# Altium footprint library 按键.PcbLib: 105 footprints (part 1 of 7)
Each footprint in its own frame and in the unit in brackets; x right, y up, seen from the top. Pads: shape width x height; smd on the part's side, far side on the other; paste and mask are expansions set on the pad; w line width, h text height; cw(c..) or ccw(c..) is an arc to the next point about the centre after c.
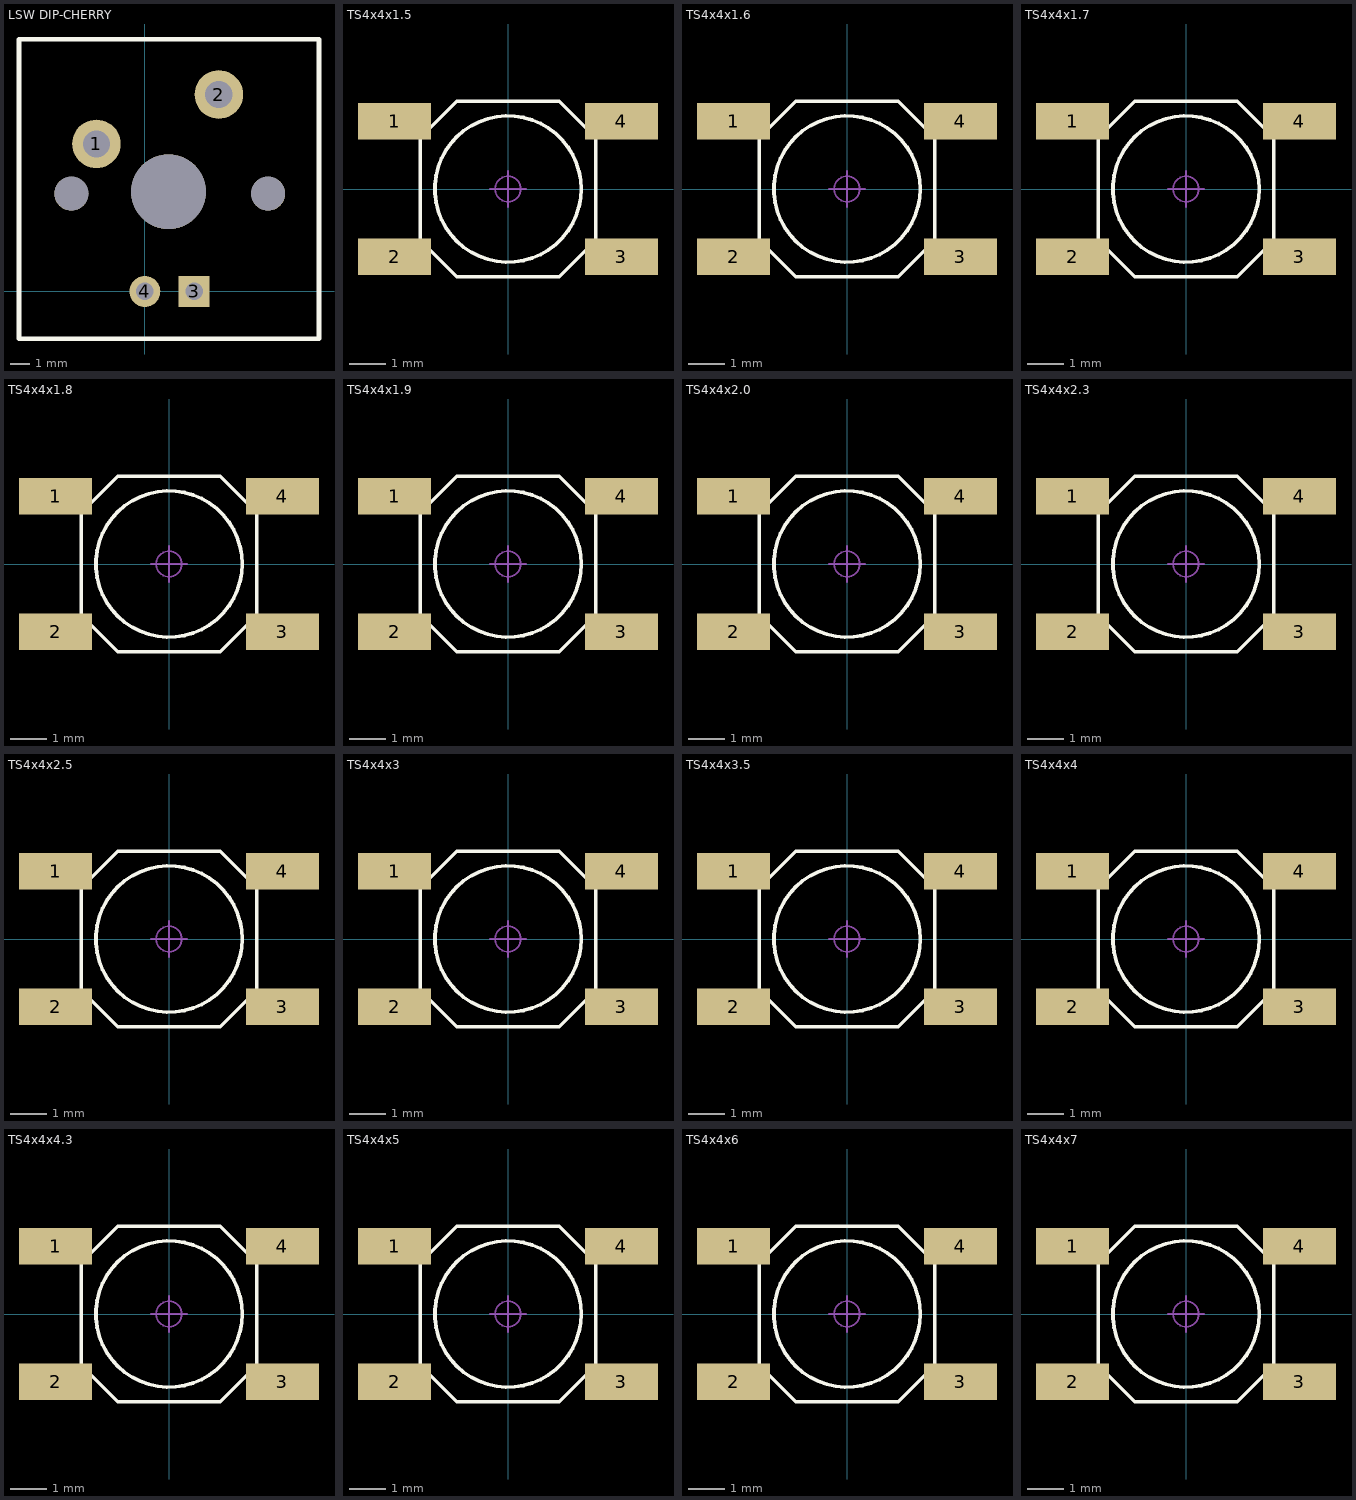
[diagram p0: the footprints below, top view; thin cyan lines are the x and y axes]

## LSW DIP-CHERRY [mm]
pads (7):
  round 2.5 hole 1.4: 1(-2.489,7.595) 2(3.81,10.135)
  rect 1.6x1.6 hole 0.9: 3(2.54,0)
  round 1.6 hole 0.9: 4(0,0)
  round 1.75 hole 1.75: ""(-3.785,5.029) ""(6.35,5.029)
  round 3.85 hole 3.85: ""(1.219,5.131)
Top Overlay:
  lines w0.254: -6.477,-2.438 -6.477,12.979 8.966,12.979 8.966,-2.438 -6.477,-2.438
3D body: height 3.45, standoff -15.75, extent -6.581,-2.669 9.019,12.931

## TS4x4x1.5 [mm] "防水轻触开关4x4x1.5"
pads (4):
  rect 2x1 smd: 1(-3.1,1.85) 2(-3.1,-1.85) 3(3.1,-1.85) 4(3.1,1.85)
Top Overlay:
  circle w0.1: c0,0 r2
  lines w0.1: -2.4,-1.4 -1.4,-2.4 1.4,-2.4 2.4,-1.4 2.4,1.4 1.4,2.4 -1.4,2.4 -2.4,1.4 -2.4,-1.4 ; 0,-2.4 0,-2.4 ; 0,2.4 0,2.4
Mechanical 15:
  circle w0.05: c0,0 r0.35
  lines w0.05: -0.5,0 0.5,0 ; 0,-0.5 0,0.5
3D body: height 1.5, standoff -0.05, extent -3.2,-2.6 3.2,2.6

## TS4x4x1.6 [mm] "防水轻触开关4x4x1.6"
pads (4):
  rect 2x1 smd: 1(-3.1,1.85) 2(-3.1,-1.85) 3(3.1,-1.85) 4(3.1,1.85)
Top Overlay:
  circle w0.1: c0,0 r2
  lines w0.1: -2.4,-1.4 -1.4,-2.4 1.4,-2.4 2.4,-1.4 2.4,1.4 1.4,2.4 -1.4,2.4 -2.4,1.4 -2.4,-1.4 ; 0,-2.4 0,-2.4 ; 0,2.4 0,2.4
Mechanical 15:
  circle w0.05: c0,0 r0.35
  lines w0.05: -0.5,0 0.5,0 ; 0,-0.5 0,0.5
3D body: height 1.6, standoff -0.05, extent -3.2,-2.6 3.2,2.6

## TS4x4x1.7 [mm] "防水轻触开关4x4x1.7"
pads (4):
  rect 2x1 smd: 1(-3.1,1.85) 2(-3.1,-1.85) 3(3.1,-1.85) 4(3.1,1.85)
Top Overlay:
  circle w0.1: c0,0 r2
  lines w0.1: -2.4,-1.4 -1.4,-2.4 1.4,-2.4 2.4,-1.4 2.4,1.4 1.4,2.4 -1.4,2.4 -2.4,1.4 -2.4,-1.4 ; 0,-2.4 0,-2.4 ; 0,2.4 0,2.4
Mechanical 15:
  circle w0.05: c0,0 r0.35
  lines w0.05: -0.5,0 0.5,0 ; 0,-0.5 0,0.5
3D body: height 1.7, standoff -0.05, extent -3.2,-2.6 3.2,2.6

## TS4x4x1.8 [mm] "防水轻触开关4x4x1.8"
pads (4):
  rect 2x1 smd: 1(-3.1,1.85) 2(-3.1,-1.85) 3(3.1,-1.85) 4(3.1,1.85)
Top Overlay:
  circle w0.1: c0,0 r2
  lines w0.1: -2.4,-1.4 -2.4,1.4 -1.4,2.4 1.4,2.4 2.4,1.4 2.4,-1.4 1.4,-2.4 -1.4,-2.4 -2.4,-1.4 ; 0,-2.4 0,-2.4 ; 0,2.4 0,2.4
Mechanical 15:
  circle w0.05: c0,0 r0.35
  lines w0.05: -0.5,0 0.5,0 ; 0,-0.5 0,0.5
3D body: height 1.8, standoff -0.05, extent -3.2,-2.6 3.2,2.6

## TS4x4x1.9 [mm] "防水轻触开关4x4x1.9"
pads (4):
  rect 2x1 smd: 1(-3.1,1.85) 2(-3.1,-1.85) 3(3.1,-1.85) 4(3.1,1.85)
Top Overlay:
  circle w0.1: c0,0 r2
  lines w0.1: -2.4,-1.4 -2.4,1.4 -1.4,2.4 1.4,2.4 2.4,1.4 2.4,-1.4 1.4,-2.4 -1.4,-2.4 -2.4,-1.4 ; 0,-2.4 0,-2.4 ; 0,2.4 0,2.4
Mechanical 15:
  circle w0.05: c0,0 r0.35
  lines w0.05: -0.5,0 0.5,0 ; 0,-0.5 0,0.5
3D body: height 1.9, standoff -0.05, extent -3.2,-2.6 3.2,2.6

## TS4x4x2.0 [mm] "防水轻触开关4x4x2.0"
pads (4):
  rect 2x1 smd: 1(-3.1,1.85) 2(-3.1,-1.85) 3(3.1,-1.85) 4(3.1,1.85)
Top Overlay:
  circle w0.1: c0,0 r2
  lines w0.1: -2.4,-1.4 -2.4,1.4 -1.4,2.4 1.4,2.4 2.4,1.4 2.4,-1.4 1.4,-2.4 -1.4,-2.4 -2.4,-1.4 ; 0,-2.4 0,-2.4 ; 0,2.4 0,2.4
Mechanical 15:
  circle w0.05: c0,0 r0.35
  lines w0.05: -0.5,0 0.5,0 ; 0,-0.5 0,0.5
3D body: height 2, standoff -0.05, extent -3.2,-2.6 3.2,2.6

## TS4x4x2.3 [mm] "防水轻触开关4x4x2.3"
pads (4):
  rect 2x1 smd: 1(-3.1,1.85) 2(-3.1,-1.85) 3(3.1,-1.85) 4(3.1,1.85)
Top Overlay:
  circle w0.1: c0,0 r2
  lines w0.1: -2.4,-1.4 -2.4,1.4 -1.4,2.4 1.4,2.4 2.4,1.4 2.4,-1.4 1.4,-2.4 -1.4,-2.4 -2.4,-1.4 ; 0,-2.4 0,-2.4 ; 0,2.4 0,2.4
Mechanical 15:
  circle w0.05: c0,0 r0.35
  lines w0.05: -0.5,0 0.5,0 ; 0,-0.5 0,0.5
3D body: height 2.3, standoff -0.05, extent -3.2,-2.6 3.2,2.6

## TS4x4x2.5 [mm] "防水轻触开关4x4x2.5"
pads (4):
  rect 2x1 smd: 1(-3.1,1.85) 2(-3.1,-1.85) 3(3.1,-1.85) 4(3.1,1.85)
Top Overlay:
  circle w0.1: c0,0 r2
  lines w0.1: -2.4,-1.4 -1.4,-2.4 1.4,-2.4 2.4,-1.4 2.4,1.4 1.4,2.4 -1.4,2.4 -2.4,1.4 -2.4,-1.4 ; 0,-2.4 0,-2.4 ; 0,2.4 0,2.4
Mechanical 15:
  circle w0.05: c0,0 r0.35
  lines w0.05: -0.5,0 0.5,0 ; 0,-0.5 0,0.5
3D body: height 2.5, standoff -0.05, extent -3.2,-2.6 3.2,2.6

## TS4x4x3 [mm] "防水轻触开关4x4x3"
pads (4):
  rect 2x1 smd: 1(-3.1,1.85) 2(-3.1,-1.85) 3(3.1,-1.85) 4(3.1,1.85)
Top Overlay:
  circle w0.1: c0,0 r2
  lines w0.1: -2.4,-1.4 -2.4,1.4 -1.4,2.4 1.4,2.4 2.4,1.4 2.4,-1.4 1.4,-2.4 -1.4,-2.4 -2.4,-1.4 ; 0,-2.4 0,-2.4 ; 0,2.4 0,2.4
Mechanical 15:
  circle w0.05: c0,0 r0.35
  lines w0.05: -0.5,0 0.5,0 ; 0,-0.5 0,0.5
3D body: height 3, standoff -0.05, extent -3.2,-2.6 3.2,2.6

## TS4x4x3.5 [mm] "防水轻触开关4x4x3.5"
pads (4):
  rect 2x1 smd: 1(-3.1,1.85) 2(-3.1,-1.85) 3(3.1,-1.85) 4(3.1,1.85)
Top Overlay:
  circle w0.1: c0,0 r2
  lines w0.1: -2.4,-1.4 -2.4,1.4 -1.4,2.4 1.4,2.4 2.4,1.4 2.4,-1.4 1.4,-2.4 -1.4,-2.4 -2.4,-1.4 ; 0,-2.4 0,-2.4 ; 0,2.4 0,2.4
Mechanical 15:
  circle w0.05: c0,0 r0.35
  lines w0.05: -0.5,0 0.5,0 ; 0,-0.5 0,0.5
3D body: height 3.5, standoff -0.05, extent -3.2,-2.6 3.2,2.6

## TS4x4x4 [mm] "防水轻触开关4x4x4"
pads (4):
  rect 2x1 smd: 1(-3.1,1.85) 2(-3.1,-1.85) 3(3.1,-1.85) 4(3.1,1.85)
Top Overlay:
  circle w0.1: c0,0 r2
  lines w0.1: -2.4,-1.4 -2.4,1.4 -1.4,2.4 1.4,2.4 2.4,1.4 2.4,-1.4 1.4,-2.4 -1.4,-2.4 -2.4,-1.4 ; 0,-2.4 0,-2.4 ; 0,2.4 0,2.4
Mechanical 15:
  circle w0.05: c0,0 r0.35
  lines w0.05: -0.5,0 0.5,0 ; 0,-0.5 0,0.5
3D body: height 4, standoff -0.05, extent -3.2,-2.6 3.2,2.6

## TS4x4x4.3 [mm] "防水轻触开关4x4x4.3"
pads (4):
  rect 2x1 smd: 1(-3.1,1.85) 2(-3.1,-1.85) 3(3.1,-1.85) 4(3.1,1.85)
Top Overlay:
  circle w0.1: c0,0 r2
  lines w0.1: -2.4,-1.4 -2.4,1.4 -1.4,2.4 1.4,2.4 2.4,1.4 2.4,-1.4 1.4,-2.4 -1.4,-2.4 -2.4,-1.4 ; 0,-2.4 0,-2.4 ; 0,2.4 0,2.4
Mechanical 15:
  circle w0.05: c0,0 r0.35
  lines w0.05: -0.5,0 0.5,0 ; 0,-0.5 0,0.5
3D body: height 4.3, standoff -0.05, extent -3.2,-2.6 3.2,2.6

## TS4x4x5 [mm] "防水轻触开关4x4x5"
pads (4):
  rect 2x1 smd: 1(-3.1,1.85) 2(-3.1,-1.85) 3(3.1,-1.85) 4(3.1,1.85)
Top Overlay:
  circle w0.1: c0,0 r2
  lines w0.1: -2.4,-1.4 -2.4,1.4 -1.4,2.4 1.4,2.4 2.4,1.4 2.4,-1.4 1.4,-2.4 -1.4,-2.4 -2.4,-1.4 ; 0,-2.4 0,-2.4 ; 0,2.4 0,2.4
Mechanical 15:
  circle w0.05: c0,0 r0.35
  lines w0.05: -0.5,0 0.5,0 ; 0,-0.5 0,0.5
3D body: height 5, standoff -0.05, extent -3.2,-2.6 3.2,2.6

## TS4x4x6 [mm] "防水轻触开关4x4x6"
pads (4):
  rect 2x1 smd: 1(-3.1,1.85) 2(-3.1,-1.85) 3(3.1,-1.85) 4(3.1,1.85)
Top Overlay:
  circle w0.1: c0,0 r2
  lines w0.1: -2.4,-1.4 -2.4,1.4 -1.4,2.4 1.4,2.4 2.4,1.4 2.4,-1.4 1.4,-2.4 -1.4,-2.4 -2.4,-1.4 ; 0,-2.4 0,-2.4 ; 0,2.4 0,2.4
Mechanical 15:
  circle w0.05: c0,0 r0.35
  lines w0.05: -0.5,0 0.5,0 ; 0,-0.5 0,0.5
3D body: height 6, standoff -0.05, extent -3.2,-2.6 3.2,2.6

## TS4x4x7 [mm] "防水轻触开关4x4x7"
pads (4):
  rect 2x1 smd: 1(-3.1,1.85) 2(-3.1,-1.85) 3(3.1,-1.85) 4(3.1,1.85)
Top Overlay:
  circle w0.1: c0,0 r2
  lines w0.1: -2.4,-1.4 -2.4,1.4 -1.4,2.4 1.4,2.4 2.4,1.4 2.4,-1.4 1.4,-2.4 -1.4,-2.4 -2.4,-1.4 ; 0,-2.4 0,-2.4 ; 0,2.4 0,2.4
Mechanical 15:
  circle w0.05: c0,0 r0.35
  lines w0.05: -0.5,0 0.5,0 ; 0,-0.5 0,0.5
3D body: height 7, standoff -0.05, extent -3.2,-2.6 3.2,2.6